# Altium footprint library common.PcbLib: 552 footprints (part 28 of 35)
Each footprint in its own frame and in the unit in brackets; x right, y up, seen from the top. Pads: shape width x height; smd on the part's side, far side on the other; paste and mask are expansions set on the pad; w line width, h text height; cw(c..) or ccw(c..) is an arc to the next point about the centre after c.
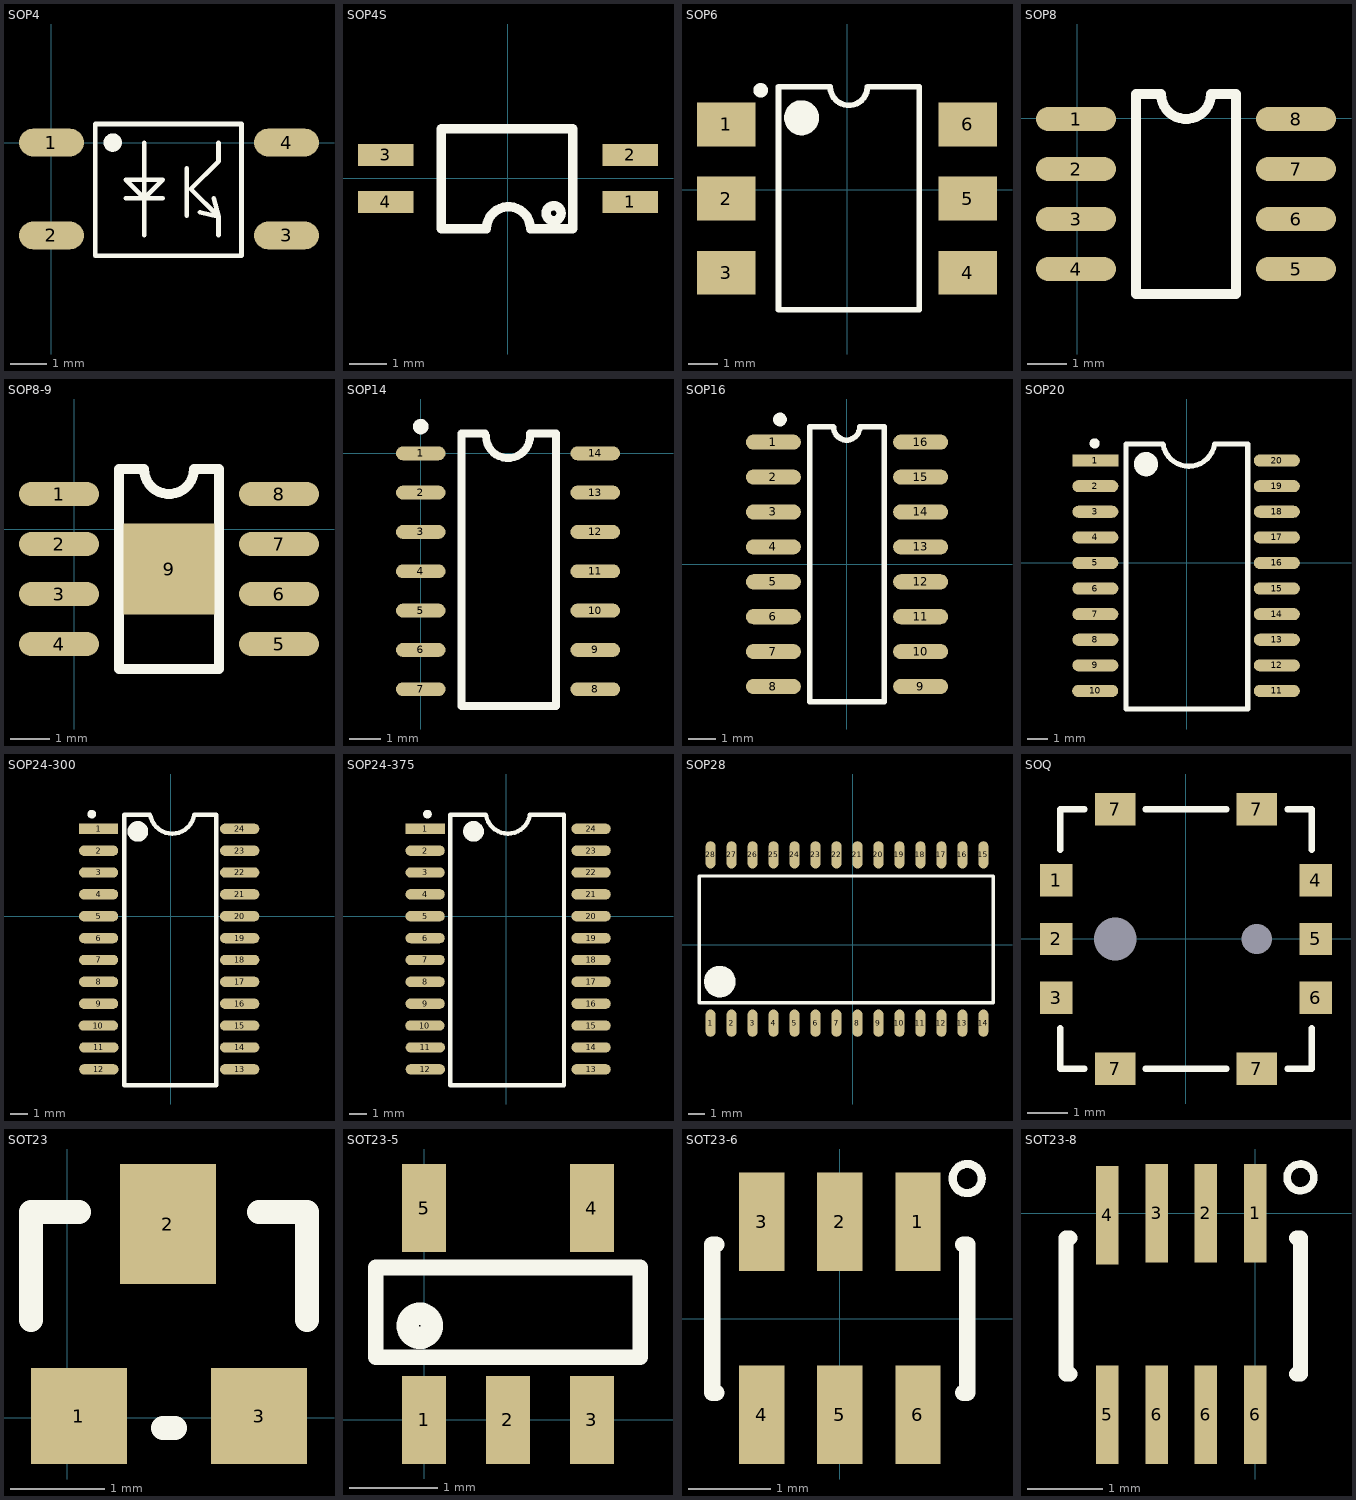
[diagram p27: the footprints below, top view; thin cyan lines are the x and y axes]

## SOP4 [mil] "AQY211G2S"
pads (4):
  oval 70x30 smd: 1(0,0) 2(0,-100) 3(253.23,-100) 4(253.23,0)
Top Overlay:
  circle w10: c65.94,0 r4.92
  lines w5: 80,-60 120,-60 ; 100,-100 100,0 ; 145.67,-78.74 145.67,-27.56 ; 160,-75 180,-80 ; 175,-60 180,-80 ; 180,-100 180,-80 ; 180,0 180,-20 150,-50 180,-80 ; 47.24,-121.73 47.24,20 204.72,20 204.72,-121.73 47.24,-121.73 ; 80,-40 120,-40 100,-60 80,-40
3D body: height 78.74, standoff -3.96, extent -7.87,-122.05 267.72,19.69

## SOP4S [mm]
pads (4):
  rect 1.5x0.6 smd: 1(3.31,-0.635) 2(3.31,0.635) 3(-3.309,0.635) 4(-3.309,-0.635)
Top Overlay:
  circle w0.254: c1.235,-0.94 r0.203
  lines w0.254: -1.805,-1.361 -1.805,1.346 ; -1.794,-1.361 -0.582,-1.361 cw(c0.013,-1.361) 0.608,-1.361 1.751,-1.361 1.751,1.346 -1.786,1.346
3D body: height 2.1, standoff 0, extent -3.492,-1.397 3.507,1.403

## SOP6 [mm]
pads (6):
  rect 2x1.5 smd: 1(-4.14,2.235) 2(-4.14,-0.305) 3(-4.14,-2.845) 4(4.14,-2.845) 5(4.14,-0.305) 6(4.14,2.235)
Top Overlay:
  circle w0.6: c-1.557,2.464 r0.3
  circle w0.25: c-2.957,3.404 r0.125
  lines w0.2: -2.349,-4.115 2.476,-4.115 2.476,3.524 0.699,3.524 cw(c0.064,3.524) -0.572,3.524 -2.349,3.524 -2.349,-4.115
3D body: height 4, standoff -0.08, extent -4.532,-4.548 4.633,3.962

## SOP8 [mil]
pads (8):
  oval 80x24 smd: 1(-1,-1) 2(-1,-51) 3(-1,-101) 4(-1,-151) 5(219,-151) 6(219,-101) 7(219,-51) 8(219,-1)
Top Overlay:
  lines w10: 59,-176 59,24 84,24 ccw(c109,24) 134,24 159,24 159,-176 59,-176
3D body: height 62.99, standoff 0, extent -8.7,-173.62 229.17,24.02

## SOP8-9 [mil]
pads (9):
  oval 80x24 smd: 1(-15,35) 2(-15,-15) 3(-15,-65) 4(-15,-115) 5(205,-115) 6(205,-65) 7(205,-15) 8(205,35)
  rect 90.55x90.55 smd: 9(95,-40)
Top Overlay:
  lines w10: 45,-140 45,60 70,60 ccw(c95,60) 120,60 145,60 145,-140 45,-140
3D body: height 62.99, standoff 0, extent -23.94,-138.82 213.93,58.82

## SOP14 [mm] "LM339"
height 1.8
pads (14):
  oval 1.6x0.45 smd mask+0.1: 1(0,0) 2(0,-1.27) 3(0,-2.54) 4(0,-3.81) 5(0,-5.08) 6(0,-6.35) 7(0,-7.62) 8(5.639,-7.62) 9(5.639,-6.35) 10(5.639,-5.08) 11(5.639,-3.81) 12(5.639,-2.54) 13(5.639,-1.27) 14(5.639,0)
Top Overlay:
  circle w0.25: c0.002,0.864 r0.125
  lines w0.254: 2.082,0.641 1.32,0.641 1.32,-8.159 4.37,-8.159 4.37,0.641 3.531,0.641 ; 2.108,0.559 ccw(c2.819,0.559) 3.53,0.583
3D body: height 1.61, standoff 0, extent -0.306,-8.16 5.894,0.54

## SOP16 [mm] "SOP, 16-Leads, Body 9.90x3.90mm, Pitch 1.27mm, IPC Medium Density"
height 1.75
pads (16):
  oval 2x0.55 smd: 1(-2.667,4.445) 2(-2.667,3.175) 3(-2.667,1.905) 4(-2.667,0.635) 5(-2.667,-0.635) 6(-2.667,-1.905) 7(-2.667,-3.175) 8(-2.667,-4.445) 9(2.692,-4.445) 10(2.692,-3.175) 11(2.692,-1.905) 12(2.692,-0.635) 13(2.692,0.635) 14(2.692,1.905) 15(2.692,3.175) 16(2.692,4.445)
Top Overlay:
  circle w0.25: c-2.425,5.27 r0.125
  lines w0.2: -0.483,5 -1.346,5 -1.346,-5 1.372,-5 1.372,5 0.475,5 ; -0.475,4.997 ccw(c0,4.996) 0.475,4.997
3D body: height 1.45, standoff 0, extent -2.927,-4.978 2.978,5.004

## SOP20 [mm]
height 2.36
pads (20):
  rect 2.286x0.6 smd: 1(-4.534,5.08)
  oval 2.286x0.6 smd: 2(-4.534,3.81) 3(-4.534,2.54) 4(-4.534,1.27) 5(-4.534,0) 6(-4.534,-1.27) 7(-4.534,-2.54) 8(-4.534,-3.81) 9(-4.534,-5.08) 10(-4.544,-6.35) 11(4.465,-6.35) 12(4.465,-5.08) 13(4.465,-3.81) 14(4.465,-2.54) 15(4.465,-1.27) 16(4.465,0) 17(4.465,1.27) 18(4.465,2.54) 19(4.465,3.81) 20(4.465,5.08)
Top Overlay:
  circle w0.6: c-2.025,4.9 r0.3
  circle w0.25: c-4.575,5.93 r0.125
  lines w0.254: -1.194,5.9 -3.025,5.9 -3.025,-7.239 3.025,-7.239 3.025,5.9 1.372,5.9 ; -1.17,5.844 ccw(c0.101,6.094) 1.372,5.842
3D body: height 2.7, standoff 0, extent -5.15,-7.009 5.15,5.791

## SOP24-300 [mil]
height 92.91
pads (24):
  rect 90x23.62 smd: 1(-164.5,200)
  oval 90x23.62 smd: 2(-164.5,150) 3(-164.5,100) 4(-164.5,50) 5(-164.5,0) 6(-164.5,-50) 7(-164.5,-100) 8(-164.5,-150) 9(-164.5,-200) 10(-164.9,-250) 11(-164,-300) 12(-164,-350) 13(158,-350) 14(158,-300) 15(158,-250) 16(158,-200) 17(158,-150) 18(158,-100) 19(158,-50) 20(158,0) 21(158,50) 22(158,100) 23(158,150) 24(158,200)
Top Overlay:
  circle w9.84: c-180.12,233.46 r4.92
  circle w23.62: c-74.81,194 r11.81
  lines w10: -47,232.28 -106,232.28 -106,-386 105,-386 105,232.28 54,232.28 ; -46.07,230.07 ccw(c3.97,239.91) 54,230

## SOP24-375 [mil]
height 92.91
pads (24):
  rect 90x23.62 smd: 1(-185.5,200)
  oval 90x23.62 smd: 2(-185.5,150) 3(-185.5,100) 4(-185.5,50) 5(-185.5,0) 6(-185.5,-50) 7(-185.5,-100) 8(-185.5,-150) 9(-185.5,-200) 10(-185.9,-250) 11(-185,-300) 12(-185,-350) 13(194,-350) 14(194,-300) 15(194,-250) 16(194,-200) 17(194,-150) 18(194,-100) 19(194,-50) 20(194,0) 21(194,50) 22(194,100) 23(194,150) 24(194,200)
Top Overlay:
  circle w23.62: c-74.81,194 r11.81
  circle w9.84: c-180.12,233.46 r4.92
  lines w10: -47,232.28 -128,232.28 -128,-386 132,-386 132,232.28 54,232.28 ; -46.07,230.07 ccw(c3.97,239.91) 54,230
3D body: height 74.8, standoff 1.06, extent -203,-383.99 209,234

## SOP28 [mm]
pads (28):
  oval 0.6x1.65 smd: 1(-8.594,-4.754) 2(-7.324,-4.754) 3(-6.054,-4.754) 4(-4.784,-4.754) 5(-3.514,-4.754) 6(-2.244,-4.754) 7(-0.974,-4.754) 8(0.296,-4.754) 9(1.566,-4.754) 10(2.836,-4.754) 11(4.106,-4.754) 12(5.376,-4.754) 13(6.646,-4.754) 14(7.916,-4.754) 15(7.916,5.431) 16(6.646,5.431) 17(5.376,5.431) 18(4.106,5.431) 19(2.836,5.431) 20(1.566,5.431) 21(0.296,5.431) 22(-0.974,5.431) 23(-2.244,5.431) 24(-3.514,5.431) 25(-4.784,5.431) 26(-6.054,5.431) 27(-7.324,5.431) 28(-8.594,5.431)
Top Overlay:
  circle w1: c-8.035,-2.239 r0.457
  lines w0.203: -9.284,4.127 -9.284,-3.514 8.517,-3.514 8.517,4.149 -9.199,4.149
3D body: height 2.59, standoff -0.05, extent -9.423,-4.903 8.657,5.767

## SOQ [mm]
height 0.127
pads (12):
  rect 0.8x0.8 smd: 1(-3.2,1.45) 2(-3.2,0) 3(-3.2,-1.45) 4(3.2,1.45) 5(3.2,0) 6(3.2,-1.45)
  rect 1x0.8 smd: 7(-1.75,-3.2) 7(-1.75,3.2) 7(1.75,-3.2) 7(1.75,3.2)
  round 0 hole 1.05: ""(-1.75,0)
  round 0 hole 0.75: ""(1.75,0)
Top Overlay:
  lines w0.152: -3.1,-2.2 -3.1,-3.2 -2.5,-3.2 ; -3.1,2.2 -3.1,3.2 -2.5,3.2 ; -1,-3.2 1,-3.2 ; -1,3.2 1,3.2 ; 2.5,-3.2 3.1,-3.2 3.1,-2.2 ; 2.5,3.2 3.1,3.2 3.1,2.2
3D body: height 5, standoff -0.5, extent -3.322,-3.2 3.322,3.2

## SOT23 [mil]
pads (3):
  rect 40x40 smd: 1(4.88,0.63) 3(79.88,0.63)
  rect 40x50 smd: 2(41.88,80.63)
Top Overlay:
  lines w10: -15.12,40.63 -15.12,85.63 4.88,85.63 ; 39.88,-4.37 44.88,-4.37 ; 79.88,85.63 99.88,85.63 99.88,40.63
3D body: height 47.24, standoff 0, extent -14.87,-11.02 99.3,99.22

## SOT23-5 [mm]
pads (5):
  rect 0.5x1 smd: 1(0,0) 2(0.95,0) 3(1.9,0) 4(1.9,2.4) 5(0,2.4)
Top Overlay:
  circle w0.254: c-0.051,1.067 r0.137
  lines w0.178: -0.55,0.711 -0.55,1.727 2.45,1.727 2.45,0.711 -0.55,0.711
3D body: height 1.09, standoff -0.01, extent -0.5,-0.201 2.399,2.599

## SOT23-6 [mm] "SOT-23/SC-74A; 5 Leads; Body 3.1 x 3 mm, inc. leads (LxW max)"
height 1.45
pads (6):
  rect 0.55x1.2 smd: 1(0.95,1.175) 2(0,1.175) 3(-0.95,1.175) 4(-0.95,-1.168) 5(0,-1.168) 6(0.95,-1.168)
Top Overlay:
  circle w0.1: c1.549,1.702 r0.177
  lines w0.2: -1.5,-0.9 -1.55,-0.9 -1.55,0.9 -1.5,0.9 ; 1.5,-0.9 1.55,-0.9 1.55,0.9 1.5,0.9
3D body: height 1, standoff 0, extent -1.435,-1.195 1.485,1.145

## SOT23-8 [mm]
pads (8):
  rect 0.3x1.3 smd: 1(0,0) 2(-0.652,0) 3(-1.304,0) 4(-1.956,-0.025) 5(-1.956,-2.667) 6(-1.304,-2.667) 6(-0.652,-2.667) 6(0,-2.667)
Top Overlay:
  circle w0.1: c0.599,0.474 r0.177
  lines w0.2: -2.45,-2.127 -2.5,-2.127 -2.5,-0.327 -2.45,-0.327 ; 0.55,-2.127 0.6,-2.127 0.6,-0.327 0.55,-0.327
3D body: height 1, standoff 0, extent -2.415,-2.696 0.485,0.104